# Altium footprint library Integrados.PcbLib: 96 footprints (part 3 of 6)
Each footprint in its own frame and in the unit in brackets; x right, y up, seen from the top. Pads: shape width x height; smd on the part's side, far side on the other; paste and mask are expansions set on the pad; w line width, h text height; cw(c..) or ccw(c..) is an arc to the next point about the centre after c.
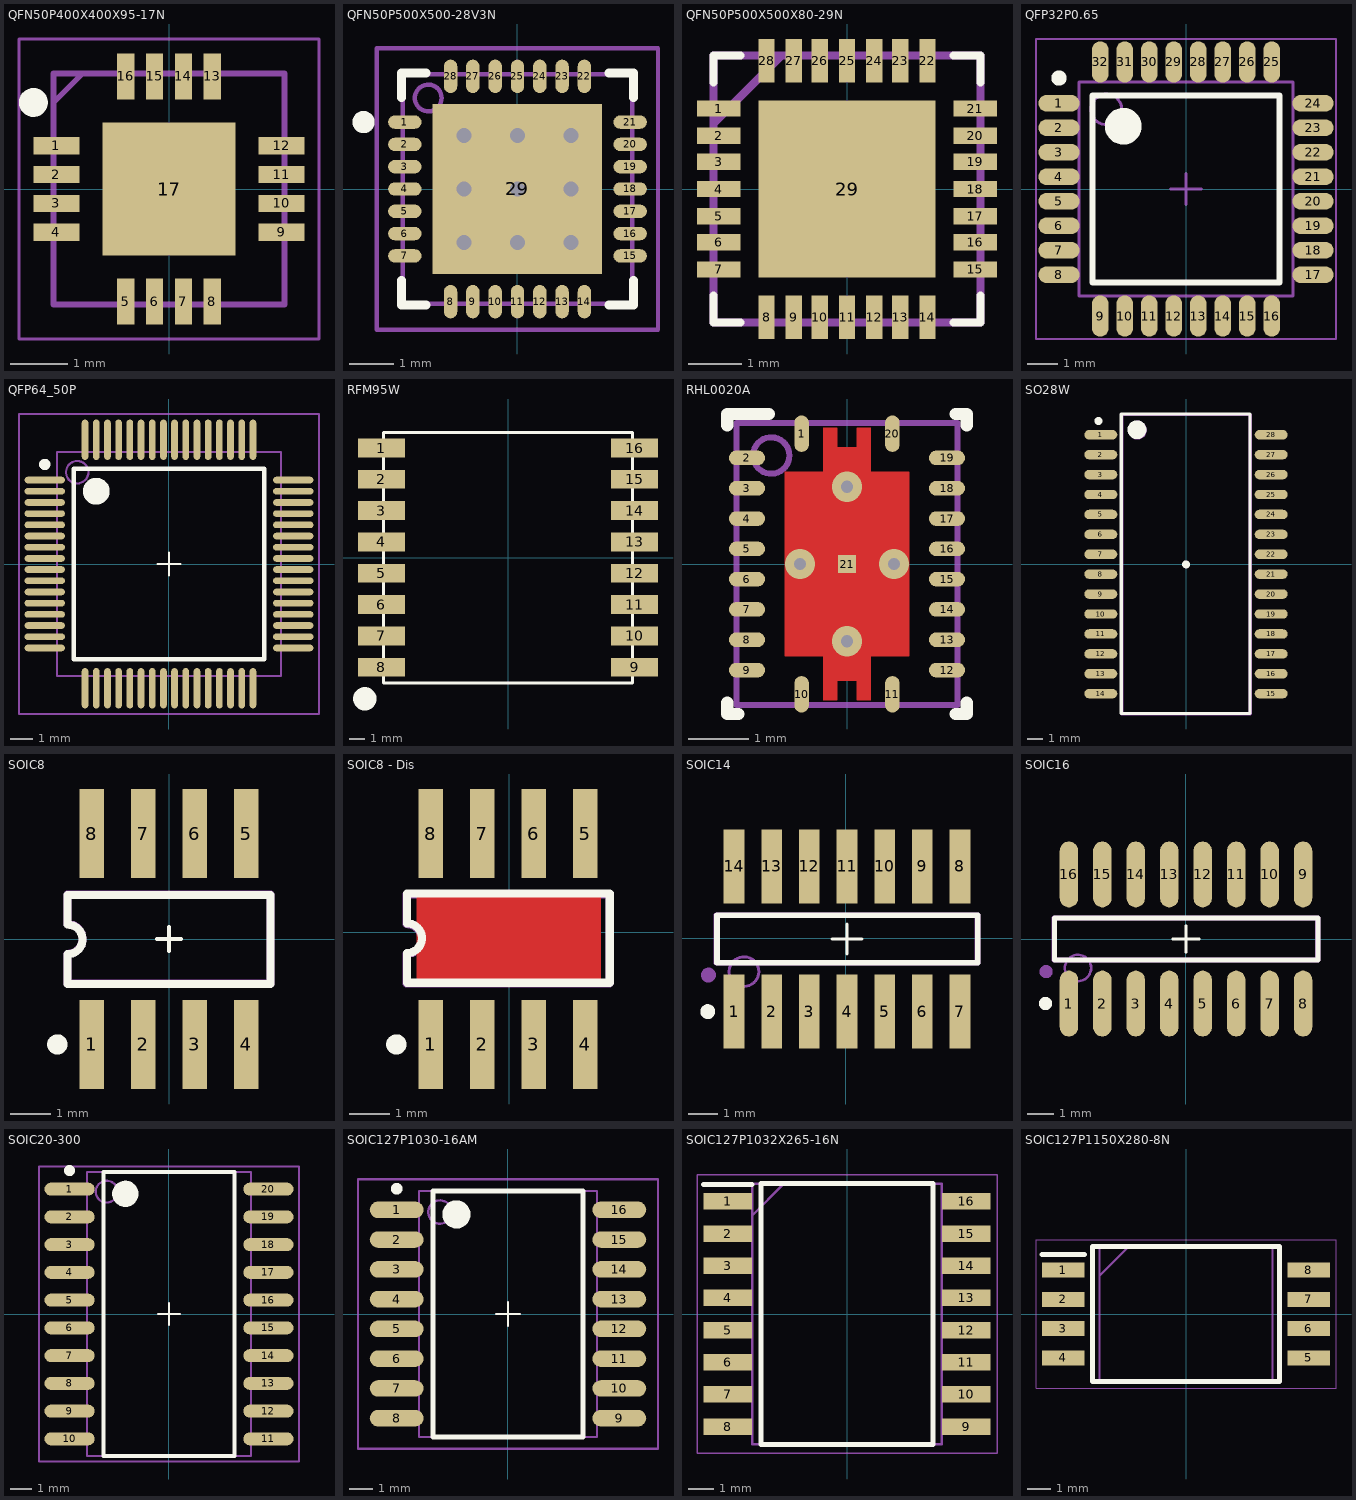
[diagram p2: the footprints below, top view; thin cyan lines are the x and y axes]

## QFN50P400X400X95-17N [mm]
pads (17):
  rect 0.8x0.3 smd: 1(-1.95,0.75) 2(-1.95,0.25) 3(-1.95,-0.25) 4(-1.95,-0.75) 9(1.95,-0.75) 10(1.95,-0.25) 11(1.95,0.25) 12(1.95,0.75)
  rect 0.3x0.8 smd: 5(-0.75,-1.95) 6(-0.25,-1.95) 7(0.25,-1.95) 8(0.75,-1.95) 13(0.75,1.95) 14(0.25,1.95) 15(-0.25,1.95) 16(-0.75,1.95)
  rect 2.3x2.3 smd: 17(0,0)
Top Overlay:
  circle w0.25: c-2.35,1.5 r0.125
Mechanical 13:
  lines w0.1: -2,1.5 -1.5,2 ; -2,-2 2,-2 2,2 -2,2 -2,-2
Mechanical 15:
  lines w0.05: -2.6,-2.6 2.6,-2.6 2.6,2.6 -2.6,2.6 -2.6,-2.6
3D body "ISL55110IRZ-T7A.stp": height 0.95, standoff 0, extent -2.05,-2.05 2.05,2.05

## QFN50P500X500-28V3N [mm] "QFN, 28-Leads, Body 5x5mm, Pitch 0.5mm, IPC Medium Density"
height 1
pads (29):
  oval 0.75x0.3 smd: 1(-2.525,1.5) 2(-2.525,1) 3(-2.525,0.5) 4(-2.525,0) 5(-2.525,-0.5) 6(-2.525,-1) 7(-2.525,-1.5) 15(2.525,-1.5) 16(2.525,-1) 17(2.525,-0.5) 18(2.525,0) 19(2.525,0.5) 20(2.525,1) 21(2.525,1.5)
  oval 0.3x0.75 smd: 8(-1.5,-2.525) 9(-1,-2.525) 10(-0.5,-2.525) 11(0,-2.525) 12(0.5,-2.525) 13(1,-2.525) 14(1.5,-2.525) 22(1.5,2.525) 23(1,2.525) 24(0.5,2.525) 25(0,2.525) 26(-0.5,2.525) 27(-1,2.525) 28(-1.5,2.525)
  rect 3.8x3.8 smd: 29(0,0)
via 1.2,-1.2 diameter 0.66 hole 0.33
via 0,-1.2 diameter 0.66 hole 0.33
via -1.2,-1.2 diameter 0.66 hole 0.33
via 1.2,0 diameter 0.66 hole 0.33
via 0,0 diameter 0.66 hole 0.33
via -1.2,0 diameter 0.66 hole 0.33
via 1.2,1.2 diameter 0.66 hole 0.33
via 0,1.2 diameter 0.66 hole 0.33
via -1.2,1.2 diameter 0.66 hole 0.33
Top Overlay:
  circle w0.25: c0,-0.01 r0.125
  circle w0.25: c-3.45,1.5 r0.125
  lines w0.2: -2.6,-2.05 -2.6,-2.6 -2.05,-2.6 ; -2.6,2.05 -2.6,2.6 -2.05,2.6 ; 2.05,-2.6 2.6,-2.6 2.6,-2.05 ; 2.05,2.6 2.6,2.6 2.6,2.05
Mechanical 15:
  lines w0.1: -3.15,-3.15 3.15,-3.15 3.15,3.15 -3.15,3.15 -3.15,-3.15
Mechanical 29:
  circle w0.1: c-2,2.04 r0.3
  lines w0.1: -2.575,-2.575 2.575,-2.575 2.575,2.575 -2.575,2.575 -2.575,-2.575
  text "'.Designator'" at -2.202,-0.169 h0.5
3D body "QFN28-0_5.STEP": height 1, standoff 0, extent -2.5,-2.5 2.5,2.5

## QFN50P500X500X80-29N [mil]
pads (29):
  rect 32x12 smd: 1(-94,59) 2(-94,39) 3(-94,20) 4(-94,0) 5(-94,-20) 6(-94,-39) 7(-94,-59) 15(94,-59) 16(94,-39) 17(94,-20) 18(94,0) 19(94,20) 20(94,39) 21(94,59)
  rect 12x32 smd: 8(-59,-94) 9(-39,-94) 10(-20,-94) 11(0,-94) 12(20,-94) 13(39,-94) 14(59,-94) 22(59,94) 23(39,94) 24(20,94) 25(0,94) 26(-20,94) 27(-39,94) 28(-59,94)
  rect 130x130 smd: 29(0,0)
Top Overlay:
  circle w9.84: c0,-0.39 r4.92
  lines w6: -98,-78 -98,-98 -78,-98 ; -98,78 -98,98 -78,98 ; 78,-98 98,-98 98,-78 ; 78,98 98,98 98,78
Mechanical 29:
  lines w6: -98,-65 -98,-53 ; -98,-45 -98,-33 ; -98,-26 -98,-14 ; -98,-6 -98,6 ; -98,14 -98,26 ; -98,33 -98,45 ; -98,48 -48,98 ; -98,53 -98,65 ; -65,-98 -53,-98 ; -65,98 -53,98 ; -45,-98 -33,-98 ; -45,98 -33,98 ; -26,-98 -14,-98 ; -26,98 -14,98 ; -6,-98 6,-98 ; -6,98 6,98 ; 14,-98 26,-98 ; 14,98 26,98 ; 33,-98 45,-98 ; 33,98 45,98 ; 53,-98 65,-98 ; 53,98 65,98 ; 98,-65 98,-53 ; 98,-45 98,-33 ; 98,-26 98,-14 ; 98,-6 98,6 ; 98,14 98,26 ; 98,33 98,45 ; 98,53 98,65 ; -98,-98 98,-98 98,98 -98,98 -98,-98
  text "'.Designator'" at -84.72,-6.63 h19.68

## QFP32P0.65 [mm]
pads (32):
  oval 1.35x0.55 smd: 1(-4.15,2.8) 2(-4.15,2) 3(-4.15,1.2) 4(-4.15,0.4) 5(-4.15,-0.4) 6(-4.15,-1.2) 7(-4.15,-2) 8(-4.15,-2.8) 17(4.15,-2.8) 18(4.15,-2) 19(4.15,-1.2) 20(4.15,-0.4) 21(4.15,0.4) 22(4.15,1.2) 23(4.15,2) 24(4.15,2.8)
  oval 0.55x1.35 smd: 9(-2.8,-4.15) 10(-2,-4.15) 11(-1.2,-4.15) 12(-0.4,-4.15) 13(0.4,-4.15) 14(1.2,-4.15) 15(2,-4.15) 16(2.8,-4.15) 25(2.8,4.15) 26(2,4.15) 27(1.2,4.15) 28(0.4,4.15) 29(-0.4,4.15) 30(-1.2,4.15) 31(-2,4.15) 32(-2.8,4.15)
Top Overlay:
  circle w0.25: c-4.15,3.625 r0.125
  circle w0.6: c-2.05,2.05 r0.3
  lines w0.2: -3.05,-3.05 -3.05,3.05 3.05,3.05 3.05,-3.05 -3.05,-3.05
Mechanical 13:
  circle w0.1: c-2.6,2.6 r0.5
  lines w0.1: -3.5,-3.5 -3.5,3.5 3.5,3.5 3.5,-3.5 -3.5,-3.5
Mechanical 15:
  lines w0.05: -4.9,-4.9 -4.9,4.9 4.9,4.9 4.9,-4.9 -4.9,-4.9
  lines w0.1: -0.5,0 0.5,0 ; 0,-0.5 0,0.5
3D body "QFP32P65.STEP": height 1.6, standoff -0.05, extent -4.51,-4.53 4.49,4.47

## QFP64_50P [mm] "50 pitch, 10x10 mm y 64 pines"
pads (64):
  oval 1.8x0.3 smd: 1(-5.55,3.75) 2(-5.55,3.25) 3(-5.55,2.75) 4(-5.55,2.25) 5(-5.55,1.75) 6(-5.55,1.25) 7(-5.55,0.75) 8(-5.55,0.25) 9(-5.55,-0.25) 10(-5.55,-0.75) 11(-5.55,-1.25) 12(-5.55,-1.75) 13(-5.55,-2.25) 14(-5.55,-2.75) 15(-5.55,-3.25) 16(-5.55,-3.75) 33(5.55,-3.75) 34(5.55,-3.25) 35(5.55,-2.75) 36(5.55,-2.25) 37(5.55,-1.75) 38(5.55,-1.25) 39(5.55,-0.75) 40(5.55,-0.25) 41(5.55,0.25) 42(5.55,0.75) 43(5.55,1.25) 44(5.55,1.75) 45(5.55,2.25) 46(5.55,2.75) 47(5.55,3.25) 48(5.55,3.75)
  oval 0.3x1.8 smd: 17(-3.75,-5.55) 18(-3.25,-5.55) 19(-2.75,-5.55) 20(-2.25,-5.55) 21(-1.75,-5.55) 22(-1.25,-5.55) 23(-0.75,-5.55) 24(-0.25,-5.55) 25(0.25,-5.55) 26(0.75,-5.55) 27(1.25,-5.55) 28(1.75,-5.55) 29(2.25,-5.55) 30(2.75,-5.55) 31(3.25,-5.55) 32(3.75,-5.55) 49(3.75,5.55) 50(3.25,5.55) 51(2.75,5.55) 52(2.25,5.55) 53(1.75,5.55) 54(1.25,5.55) 55(0.75,5.55) 56(0.25,5.55) 57(-0.25,5.55) 58(-0.75,5.55) 59(-1.25,5.55) 60(-1.75,5.55) 61(-2.25,5.55) 62(-2.75,5.55) 63(-3.25,5.55) 64(-3.75,5.55)
Top Overlay:
  circle w0.6: c-3.25,3.25 r0.3
  circle w0.25: c-5.55,4.45 r0.125
  lines w0.1: -0.5,0 0.5,0 ; 0,-0.5 0,0.5
  lines w0.2: -4.25,-4.25 4.25,-4.25 4.25,4.25 -4.25,4.25 -4.25,-4.25
Mechanical 15:
  lines w0.1: -6.7,-6.7 6.7,-6.7 6.7,6.7 -6.7,6.7 -6.7,-6.7
Mechanical 29:
  circle w0.1: c-4.1,4.1 r0.5
  lines w0.1: -5,-5 5,-5 5,5 -5,5 -5,-5
  text "'.Designator'" at -2.582,-0.159 h0.5
3D body "QFP64p50.step": height 1.75, standoff 0, extent -5.994,-6.008 6.034,6.02

## RFM95W [mm] "LoRA RFM95"
pads (16):
  rect 3x1.2 smd: 1(-8.08,7) 2(-8.08,5) 3(-8.08,3) 4(-8.08,1) 5(-8.08,-1) 6(-8.08,-3) 7(-8.08,-5) 8(-8.08,-7) 9(8.08,-7) 10(8.08,-5) 11(8.08,-3) 12(8.08,-1) 13(8.08,1) 14(8.08,3) 15(8.08,5) 16(8.08,7)
Top Overlay:
  lines w0.203: -7.945,-8 -7.945,8 7.945,8 7.945,-8 -7.945,-8
  lines w0.889: -8.856,-8.935 ccw(c-9.144,-9.017) -8.844,-9.017
3D body "User Library-RA-02.step": height 3.2, standoff 0, extent -8,-8.5 8,8.5

## RHL0020A [mm] "QFN, 20-Leads, Body 4.5x3.5mm, Pitch 0.5mm, Thermal Pad 3.05x2.05mm, TI Recommended"
height 1
pads (21):
  oval 0.24x0.6 smd: 1(-0.75,2.15) 10(-0.75,-2.15) 11(0.75,-2.15) 20(0.75,2.15)
  oval 0.6x0.24 smd: 2(-1.65,1.75) 3(-1.65,1.25) 4(-1.65,0.75) 5(-1.65,0.25) 6(-1.65,-0.25) 7(-1.65,-0.75) 8(-1.65,-1.25) 9(-1.65,-1.75) 12(1.65,-1.75) 13(1.65,-1.25) 14(1.65,-0.75) 15(1.65,-0.25) 16(1.65,0.25) 17(1.65,0.75) 18(1.65,1.25) 19(1.65,1.75)
  rect 0.3x0.3 smd paste-0.15 mask+0: 21(0,0)
via -0.775,0 diameter 0.5 hole 0.2
via 0,1.275 diameter 0.5 hole 0.2
via 0.775,0 diameter 0.5 hole 0.2
via 0,-1.275 diameter 0.5 hole 0.2
Top Layer:
  region: 0.16,2.25 0.16,1.925 -0.16,1.925 -0.16,2.25 -0.39,2.25 -0.39,1.525 -1.025,1.525 -1.025,-1.525 -0.39,-1.525 -0.39,-2.25 -0.16,-2.25 -0.16,-1.925 0.16,-1.925 0.16,-2.25 0.39,-2.25 0.39,-1.525 1.025,-1.525 1.025,1.525 0.39,1.525 0.39,2.25
Top Overlay:
  lines w0.2: -1.975,-2.29 -1.975,-2.475 -1.79,-2.475 ; -1.975,2.29 -1.975,2.475 -1.29,2.475 ; 1.79,-2.475 1.975,-2.475 1.975,-2.29 ; 1.79,2.475 1.975,2.475 1.975,2.29
Top Paste:
  rectangle: 0.1,-1.428 1.017,-0.1
  region: -0.1,-0.1 -1.017,-0.1 -1.017,-1.428 -0.1,-1.428
  region: -0.1,1.428 -1.017,1.428 -1.017,0.1 -0.1,0.1
  rectangle: 0.1,0.1 1.017,1.428
  rectangle: -0.39,1.628 0.39,1.925
  rectangle: -0.39,-1.925 0.39,-1.628
Mechanical 29:
  circle w0.1: c-1.25,1.79 r0.3
  lines w0.1: -1.825,-2.325 1.825,-2.325 1.825,2.325 -1.825,2.325 -1.825,-2.325
  text "'.Designator'" at 0.299,-2.202 h0.5
3D body: height 1.01, standoff 0.5, extent -1.049,1.476 -0.451,2.074
3D body: height 1, standoff 0, extent -1.825,-2.325 1.825,2.325

## SO28W [mm] "Pitch 1.27 mm"
pads (28):
  oval 2.1x0.6 smd: 1(-5.43,8.255) 2(-5.43,6.985) 3(-5.43,5.715) 4(-5.43,4.445) 5(-5.43,3.175) 6(-5.43,1.905) 7(-5.43,0.635) 8(-5.43,-0.635) 9(-5.43,-1.905) 10(-5.43,-3.175) 11(-5.43,-4.445) 12(-5.43,-5.715) 13(-5.43,-6.985) 14(-5.43,-8.255) 15(5.43,-8.255) 16(5.43,-6.985) 17(5.43,-5.715) 18(5.43,-4.445) 19(5.43,-3.175) 20(5.43,-1.905) 21(5.43,-0.635) 22(5.43,0.635) 23(5.43,1.905) 24(5.43,3.175) 25(5.43,4.445) 26(5.43,5.715) 27(5.43,6.985) 28(5.43,8.255)
Top Overlay:
  circle w0.25: c0,-0.01 r0.125
  circle w0.6: c-3.13,8.58 r0.3
  circle w0.25: c-5.58,9.135 r0.125
  lines w0.2: -4.13,-9.52 4.07,-9.52 4.07,9.58 -4.13,9.58 -4.13,-9.52
Mechanical 29:
  circle w0.6: c-3.1,8.55 r0.3
  lines w0.2: -4.1,-9.55 -4.1,9.55 4.1,9.55 4.1,-9.55 -4.1,-9.55
  text "'.Designator'" at 0.059,-0.372 h0.5
3D body "SOIC-28-300.STEP": height 2.44, standoff -0.16, extent -5.266,-9.05 5.334,9.05

## SOIC8 [mm]
pads (8):
  rect 0.6x2.2 smd: 1(-1.905,-2.6) 2(-0.635,-2.6) 3(0.635,-2.6) 4(1.905,-2.6) 5(1.905,2.6) 6(0.635,2.6) 7(-0.635,2.6) 8(-1.905,2.6)
Top Overlay:
  circle w0.25: c-2.755,-2.6 r0.125
  lines w0.1: -0.3,0 0.3,0 ; 0,-0.3 0,0.3
  lines w0.2: -2.5,-1.11 -2.5,-0.377 ccw(c-2.5,-0.01) -2.5,0.357 -2.5,1.09 2.5,1.09 2.5,-1.11 -2.5,-1.11
Mechanical 29:
  lines w0.2: -2.5,-1.1 2.5,-1.1 2.5,1.1 -2.5,1.1 -2.5,0.367 cw(c-2.5,0) -2.5,-0.367 -2.5,-1.1
3D body "so-8.step": height 1.88, standoff -0.03, extent -2.516,-3.118 2.488,3.22

## SOIC8 - Dis [mm]
pads (8):
  rect 0.6x2.2 smd: 1(-1.936,-2.77) 2(-0.666,-2.77) 3(0.604,-2.77) 4(1.874,-2.77) 5(1.874,2.43) 6(0.604,2.43) 7(-0.666,2.43) 8(-1.936,2.43)
Top Layer:
  rectangle: -2.286,-1.27 2.261,0.94
Top Overlay:
  circle w0.25: c-2.786,-2.77 r0.125
  lines w0.2: -2.521,-1.25 -2.521,-0.517 ccw(c-2.521,-0.15) -2.521,0.216 -2.521,0.95 2.479,0.95 2.479,-1.25 -2.521,-1.25
Mechanical 29:
  lines w0.2: -2.531,-1.27 2.469,-1.27 2.469,0.93 -2.531,0.93 -2.531,0.196 cw(c-2.531,-0.17) -2.531,-0.537 -2.531,-1.27
  text "'.Designator'" at -1.832,-0.389 h0.5
3D body "so-8.step": height 1.88, standoff -0.03, extent -2.547,-3.289 2.457,3.05

## SOIC14 [mm]
pads (14):
  rect 0.7x2.5 smd: 1(-3.766,-2.473) 2(-2.496,-2.473) 3(-1.226,-2.473) 4(0.044,-2.473) 5(1.314,-2.473) 6(2.584,-2.473) 7(3.854,-2.473) 8(3.854,2.427) 9(2.584,2.427) 10(1.314,2.427) 11(0.044,2.427) 12(-1.226,2.427) 13(-2.496,2.427) 14(-3.766,2.427)
Top Overlay:
  circle w0.25: c-4.656,-2.473 r0.125
  lines w0.1: -0.456,-0.023 0.544,-0.023 ; 0.044,-0.523 0.044,0.477
  lines w0.2: -4.346,-0.823 -4.346,0.777 4.454,0.777 4.454,-0.823 -4.346,-0.823
Mechanical 13:
  circle w0.1: c-3.431,-1.123 r0.5
Mechanical 29:
  circle w0.25: c-4.63,-1.24 r0.125
  lines w0.2: -4.356,-0.823 4.444,-0.823 4.444,0.777 -4.356,0.777 -4.356,-0.823
3D body "SOIC14.step": height 1.65, standoff 0, extent -4.24,-3.112 4.36,2.968

## SOIC16 [mm]
pads (16):
  oval 0.7x2.5 smd: 1(-4.445,-2.45) 2(-3.175,-2.45) 3(-1.905,-2.45) 4(-0.635,-2.45) 5(0.635,-2.45) 6(1.905,-2.45) 7(3.175,-2.45) 8(4.445,-2.45) 9(4.445,2.45) 10(3.175,2.45) 11(1.905,2.45) 12(0.635,2.45) 13(-0.635,2.45) 14(-1.905,2.45) 15(-3.175,2.45) 16(-4.445,2.45)
Top Overlay:
  circle w0.25: c-5.335,-2.45 r0.125
  lines w0.1: -0.5,0 0.5,0 ; 0,-0.5 0,0.5
  lines w0.2: -4.99,-0.8 5.01,-0.8 5.01,0.8 -4.99,0.8 -4.99,-0.8
Mechanical 13:
  circle w0.1: c-4.1,-1.1 r0.5
Mechanical 29:
  circle w0.25: c-5.31,-1.24 r0.125
  lines w0.2: -5,-0.8 -5,0.8 5,0.8 5,-0.8 -5,-0.8
  text "'.Designator'" at -0.396,-0.038 h0.5
3D body "SOIC16.step": height 1.65, standoff 0, extent -5.059,-2.986 4.941,3.094

## SOIC20-300 [mm] "DW"
pads (20):
  oval 2.3x0.6 smd: 1(-4.55,5.715) 2(-4.55,4.445) 3(-4.55,3.175) 4(-4.55,1.905) 5(-4.55,0.635) 6(-4.55,-0.635) 7(-4.55,-1.905) 8(-4.55,-3.175) 9(-4.55,-4.445) 10(-4.55,-5.715) 11(4.55,-5.715) 12(4.55,-4.445) 13(4.55,-3.175) 14(4.55,-1.905) 15(4.55,-0.635) 16(4.55,0.635) 17(4.55,1.905) 18(4.55,3.175) 19(4.55,4.445) 20(4.55,5.715)
Top Overlay:
  circle w0.6: c-2,5.5 r0.3
  circle w0.25: c-4.55,6.565 r0.125
  lines w0.1: -0.5,0 0.5,0 ; 0,-0.5 0,0.5
  lines w0.2: -3,-6.5 3,-6.5 3,6.5 -3,6.5 -3,-6.5
Mechanical 15:
  lines w0.1: -5.95,-6.75 5.95,-6.75 5.95,6.75 -5.95,6.75 -5.95,-6.75
Mechanical 29:
  circle w0.1: c-2.85,5.6 r0.5
  lines w0.1: -3.75,-6.5 3.75,-6.5 3.75,6.5 -3.75,6.5 -3.75,-6.5
  text "'.Designator'" at 0.079,-0.367 h0.5
3D body "SOIC20-300.step": height 2.65, standoff 0, extent -5.147,-6.4 5.153,6.4

## SOIC127P1030-16AM [mm] "SOIC, 16-Leads, Body 10.3x7.5mm, Pitch 1.27mm, IPC Low Density"
height 2.67
pads (16):
  oval 2.3x0.7 smd: 1(-4.75,4.445) 2(-4.75,3.175) 3(-4.75,1.905) 4(-4.75,0.635) 5(-4.75,-0.635) 6(-4.75,-1.905) 7(-4.75,-3.175) 8(-4.75,-4.445) 9(4.75,-4.445) 10(4.75,-3.175) 11(4.75,-1.905) 12(4.75,-0.635) 13(4.75,0.635) 14(4.75,1.905) 15(4.75,3.175) 16(4.75,4.445)
Top Overlay:
  circle w0.6: c-2.2,4.25 r0.3
  circle w0.25: c-4.75,5.345 r0.125
  lines w0.1: -0.5,0 0.5,0 ; 0,-0.5 0,0.5
  lines w0.2: -3.2,-5.25 3.2,-5.25 3.2,5.25 -3.2,5.25 -3.2,-5.25
Mechanical 15:
  lines w0.1: -6.4,-5.75 6.4,-5.75 6.4,5.75 -6.4,5.75 -6.4,-5.75
Mechanical 29:
  circle w0.1: c-2.9,4.35 r0.5
  lines w0.1: -3.8,-5.25 3.8,-5.25 3.8,5.25 -3.8,5.25 -3.8,-5.25
  text "'.Designator'" at 0.069,-0.322 h0.5
3D body "SOIC16-300.step": height 2.65, standoff 0, extent -5.074,-5.175 5.226,5.125

## SOIC127P1032X265-16N [mm]
pads (16):
  rect 1.925x0.65 smd: 1(-4.712,4.445) 2(-4.712,3.175) 3(-4.712,1.905) 4(-4.712,0.635) 5(-4.712,-0.635) 6(-4.712,-1.905) 7(-4.712,-3.175) 8(-4.712,-4.445) 9(4.712,-4.445) 10(4.712,-3.175) 11(4.712,-1.905) 12(4.712,-0.635) 13(4.712,0.635) 14(4.712,1.905) 15(4.712,3.175) 16(4.712,4.445)
Top Overlay:
  lines w0.2: -5.675,5.12 -3.75,5.12 ; -3.4,-5.15 -3.4,5.15 3.4,5.15 3.4,-5.15 -3.4,-5.15
Mechanical 13:
  lines w0.1: -3.75,3.88 -2.48,5.15 ; -3.75,-5.15 -3.75,5.15 3.75,5.15 3.75,-5.15 -3.75,-5.15
Mechanical 15:
  lines w0.05: -5.925,-5.5 -5.925,5.5 5.925,5.5 5.925,-5.5 -5.925,-5.5
3D body "ADUM3160BRWZ.stp": height 2.65, standoff 0, extent -5.162,-5.15 5.162,5.15

## SOIC127P1150X280-8N [mm]
pads (8):
  rect 1.85x0.65 smd: 1(-5.325,1.905) 2(-5.325,0.635) 3(-5.325,-0.635) 4(-5.325,-1.905) 5(5.325,-1.905) 6(5.325,-0.635) 7(5.325,0.635) 8(5.325,1.905)
Top Overlay:
  lines w0.2: -6.25,2.58 -4.4,2.58 ; -4.05,-2.925 4.05,-2.925 4.05,2.925 -4.05,2.925 -4.05,-2.925
Mechanical 13:
  lines w0.1: -3.75,1.655 -2.48,2.925 ; -3.75,-2.925 3.75,-2.925 3.75,2.925 -3.75,2.925 -3.75,-2.925
Mechanical 15:
  lines w0.05: -6.5,-3.225 6.5,-3.225 6.5,3.225 -6.5,3.225 -6.5,-3.225
3D body "ISO224ADWVR.stp": height 2.8, standoff 0, extent -5.75,-2.925 5.75,2.925